# Altium footprint library sun_library.PcbLib: 412 footprints (part 15 of 26)
Each footprint in its own frame and in the unit in brackets; x right, y up, seen from the top. Pads: shape width x height; smd on the part's side, far side on the other; paste and mask are expansions set on the pad; w line width, h text height; cw(c..) or ccw(c..) is an arc to the next point about the centre after c.
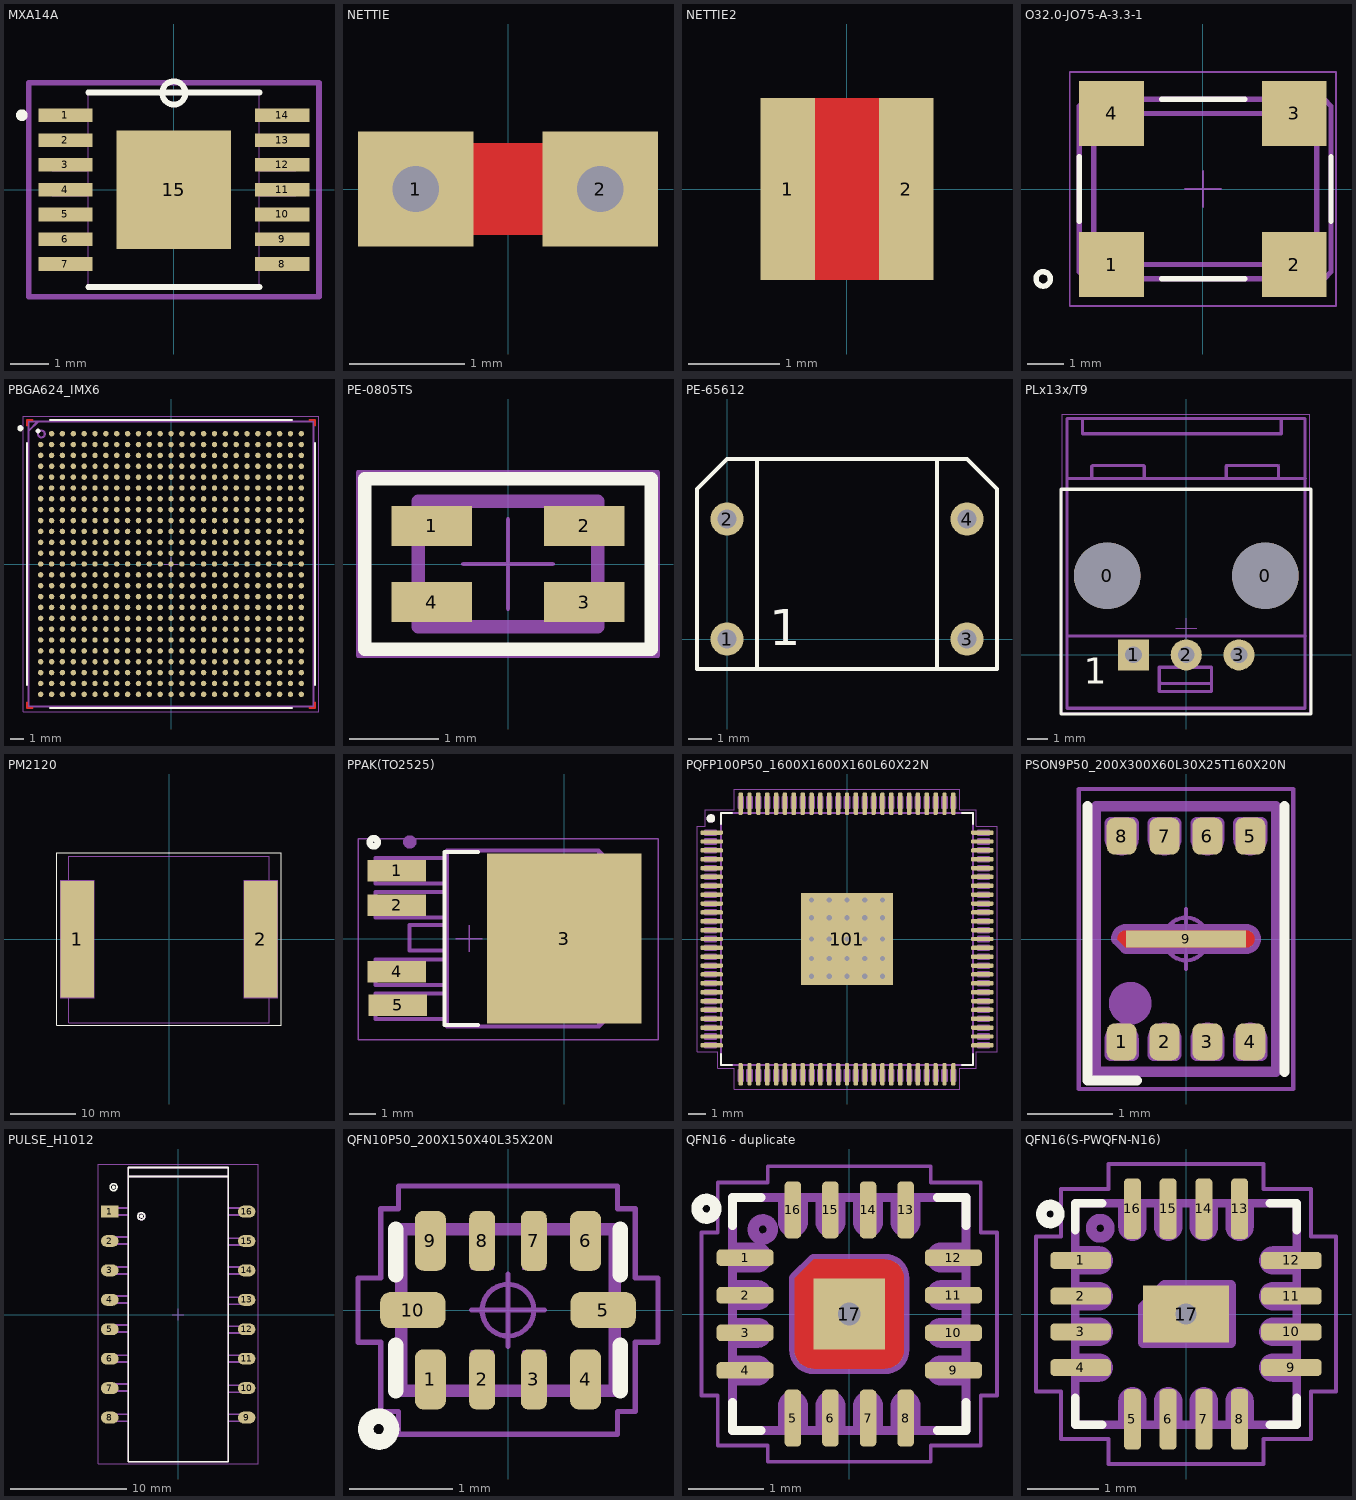
[diagram p14: the footprints below, top view; thin cyan lines are the x and y axes]

## MXA14A [mil]
pads (15):
  rect 56x14 smd paste+0 mask+0: 1(-112,76.77) 2(-112,51.18) 3(-112,25.59) 4(-112,0) 5(-112,-25.59) 6(-112,-51.18) 7(-112,-76.77) 8(112,-76.77) 9(112,-51.18) 10(112,-25.59) 11(112,0) 12(112,25.59) 13(112,51.18) 14(112,76.77)
  rect 118x122 smd paste+0 mask+0: 15(0,0)
Top Overlay:
  lines w6: -88.5,-100.5 88.5,-100.5 ; -88.5,100.5 88.5,100.5 ; -160,77 cw(c-157,77) -157,80 cw(c-157,77) -154,77 cw(c-157,77) -157,74 cw(c-157,77) -160,77 ; -12,100 cw(c0,100) 0,112 cw(c0,100) 12,100 cw(c0,100) 0,88 cw(c0,100) -12,100
3DTop 1:
  lines w1: -160,77 cw(c-157,77) -157,80 cw(c-157,77) -154,77 cw(c-157,77) -157,74 cw(c-157,77) -160,77 ; -126,-82.77 -126,-70.77 -88.5,-70.77 -88.5,-82.77 -126,-82.77 ; -126,-57.18 -126,-45.18 -88.5,-45.18 -88.5,-57.18 -126,-57.18 ; -126,-31.59 -126,-19.59 -88.5,-19.59 -88.5,-31.59 -126,-31.59 ; -126,-6 -126,6 -88.5,6 -88.5,-6 -126,-6 ; -126,19.59 -126,31.59 -88.5,31.59 -88.5,19.59 -126,19.59 ; -126,45.18 -126,57.18 -88.5,57.18 -88.5,45.18 -126,45.18 ; -126,70.77 -126,82.77 -88.5,82.77 -88.5,70.77 -126,70.77 ; -88.5,-100.5 88.5,-100.5 88.5,100.5 -88.5,100.5 -88.5,-100.5 ; -12,100 cw(c0,100) 0,112 cw(c0,100) 12,100 cw(c0,100) 0,88 cw(c0,100) -12,100 ; 88.5,-82.77 88.5,-70.77 126,-70.77 126,-82.77 88.5,-82.77 ; 88.5,-57.18 88.5,-45.18 126,-45.18 126,-57.18 88.5,-57.18 ; 88.5,-31.59 88.5,-19.59 126,-19.59 126,-31.59 88.5,-31.59 ; 88.5,-6 88.5,6 126,6 126,-6 88.5,-6 ; 88.5,19.59 88.5,31.59 126,31.59 126,19.59 88.5,19.59 ; 88.5,45.18 88.5,57.18 126,57.18 126,45.18 88.5,45.18 ; 88.5,70.77 88.5,82.77 126,82.77 126,70.77 88.5,70.77
CourtBot 16:
  lines w6: -150,-110.5 -150,110.5 150,110.5 150,-110.5 -150,-110.5
3D body "User Library-tssop14-2.step": height 47.24, standoff 0, extent -125.98,-100.39 125.99,100.4

## NETTIE [mm]
pads (2):
  rect 1x1 hole 0.4 paste+0: 1(-0.8,0) 2(0.8,0)
Top:
  rectangle: -0.4,-0.4 0.4,0.4
Bottom:
  rectangle: -0.4,-0.4 0.4,0.4

## NETTIE2 [mm]
pads (2):
  rect 0.6x2 smd paste+0: 1(-0.65,0) 2(0.65,0)
Top:
  rectangle: -0.4,-1 0.4,1

## O32.0-JO75-A-3.3-1 [mm]
height 1.2
pads (4):
  rect 1.8x1.8 smd: 1(-2.54,-2.1) 2(2.54,-2.1) 3(2.54,2.1) 4(-2.54,2.1)
Top Overlay:
  lines w0.15: -4.24,-2.5 cw(c-4.44,-2.5) -4.24,-2.49 ; -3.44,-0.9 -3.44,0.9 ; -1.14,-2.5 1.16,-2.5 ; -1.14,2.5 1.16,2.5 ; 3.56,-0.9 3.56,0.9
TopAssy 13:
  lines w0.15: -3.075,-2.5 -3.075,-2.675 -1.95,-2.675 -1.95,-2.5 ; -3.075,2.5 -3.075,2.675 -1.95,2.675 -1.95,2.5 ; 2.075,2.5 2.075,2.675 3.2,2.675 3.2,2.5 ; 2.1,-2.5 2.1,-2.675 3.225,-2.675 3.225,-2.5 ; -3.44,-2.3 -3.44,2.3 -3.24,2.5 3.36,2.5 3.56,2.3 3.56,-2.3 3.36,-2.5 -3.24,-2.5 -3.44,-2.3 ; -3.04,-2.1 -3.04,2.1 3.16,2.1 3.16,-2.1 -3.04,-2.1
CourtTop 15:
  lines w0.05: -0.5,0 0.5,0 ; 0,-0.5 0,0.5 ; -3.7,-3.25 -3.7,3.25 3.7,3.25 3.7,-3.25 -3.7,-3.25
3D body "User Library-GeyerElectronics_KX13.step": height 1.31, standoff 0, extent -3.44,-2.5 3.56,2.5

## PBGA624_IMX6 [mm] "Creator MM"
pads (624):
  round 0.4 smd mask+0.05: A2(-8.8,9.6) A3(-8,9.6) A4(-7.2,9.6) A5(-6.4,9.6) A6(-5.6,9.6) A7(-4.8,9.6) A8(-4,9.6) A9(-3.2,9.6) A10(-2.4,9.6) A11(-1.6,9.6) A12(-0.8,9.6) A13(0,9.6) A14(0.8,9.6) A15(1.6,9.6) A16(2.4,9.6) A17(3.2,9.6) A18(4,9.6) A19(4.8,9.6) A20(5.6,9.6) A21(6.4,9.6) A22(7.2,9.6) A23(8,9.6) A24(8.8,9.6) A25(9.6,9.6) AA1(-9.6,-6.4) AA2(-8.8,-6.4) AA3(-8,-6.4) AA4(-7.2,-6.4) AA5(-6.4,-6.4) AA6(-5.6,-6.4) AA7(-4.8,-6.4) AA8(-4,-6.4) AA9(-3.2,-6.4) AA10(-2.4,-6.4) AA11(-1.6,-6.4) AA12(-0.8,-6.4) AA13(0,-6.4) AA14(0.8,-6.4) AA15(1.6,-6.4) AA16(2.4,-6.4) AA17(3.2,-6.4) AA18(4,-6.4) AA19(4.8,-6.4) AA20(5.6,-6.4) AA21(6.4,-6.4) AA22(7.2,-6.4) AA23(8,-6.4) AA24(8.8,-6.4) AA25(9.6,-6.4) AB1(-9.6,-7.2) AB2(-8.8,-7.2) AB3(-8,-7.2) AB4(-7.2,-7.2) AB5(-6.4,-7.2) AB6(-5.6,-7.2) AB7(-4.8,-7.2) AB8(-4,-7.2) AB9(-3.2,-7.2) AB10(-2.4,-7.2) AB11(-1.6,-7.2) AB12(-0.8,-7.2) AB13(0,-7.2) AB14(0.8,-7.2) AB15(1.6,-7.2) AB16(2.4,-7.2) AB17(3.2,-7.2) AB18(4,-7.2) AB19(4.8,-7.2) AB20(5.6,-7.2) AB21(6.4,-7.2) AB22(7.2,-7.2) AB23(8,-7.2) AB24(8.8,-7.2) AB25(9.6,-7.2) AC1(-9.6,-8) AC2(-8.8,-8) AC3(-8,-8) AC4(-7.2,-8) AC5(-6.4,-8) AC6(-5.6,-8) AC7(-4.8,-8) AC8(-4,-8) AC9(-3.2,-8) AC10(-2.4,-8) AC11(-1.6,-8) AC12(-0.8,-8) AC13(0,-8) AC14(0.8,-8) AC15(1.6,-8) AC16(2.4,-8) AC17(3.2,-8) AC18(4,-8) AC19(4.8,-8) AC20(5.6,-8) AC21(6.4,-8) AC22(7.2,-8) AC23(8,-8) AC24(8.8,-8) AC25(9.6,-8) AD1(-9.6,-8.8) AD2(-8.8,-8.8) AD3(-8,-8.8) AD4(-7.2,-8.8) AD5(-6.4,-8.8) AD6(-5.6,-8.8) AD7(-4.8,-8.8) AD8(-4,-8.8) AD9(-3.2,-8.8) AD10(-2.4,-8.8) AD11(-1.6,-8.8) AD12(-0.8,-8.8) AD13(0,-8.8) AD14(0.8,-8.8) AD15(1.6,-8.8) AD16(2.4,-8.8) AD17(3.2,-8.8) AD18(4,-8.8) AD19(4.8,-8.8) AD20(5.6,-8.8) AD21(6.4,-8.8) AD22(7.2,-8.8) AD23(8,-8.8) AD24(8.8,-8.8) AD25(9.6,-8.8) AE1(-9.6,-9.6) AE2(-8.8,-9.6) AE3(-8,-9.6) AE4(-7.2,-9.6) AE5(-6.4,-9.6) AE6(-5.6,-9.6) AE7(-4.8,-9.6) AE8(-4,-9.6) AE9(-3.2,-9.6) AE10(-2.4,-9.6) AE11(-1.6,-9.6) AE12(-0.8,-9.6) AE13(0,-9.6) AE14(0.8,-9.6) AE15(1.6,-9.6) AE16(2.4,-9.6) AE17(3.2,-9.6) AE18(4,-9.6) AE19(4.8,-9.6) AE20(5.6,-9.6) AE21(6.4,-9.6) AE22(7.2,-9.6) AE23(8,-9.6) AE24(8.8,-9.6) AE25(9.6,-9.6) B1(-9.6,8.8) B2(-8.8,8.8) B3(-8,8.8) B4(-7.2,8.8) B5(-6.4,8.8) B6(-5.6,8.8) B7(-4.8,8.8) B8(-4,8.8) B9(-3.2,8.8) B10(-2.4,8.8) B11(-1.6,8.8) B12(-0.8,8.8) B13(0,8.8) B14(0.8,8.8) B15(1.6,8.8) B16(2.4,8.8) B17(3.2,8.8) B18(4,8.8) B19(4.8,8.8) B20(5.6,8.8) B21(6.4,8.8) B22(7.2,8.8) B23(8,8.8) B24(8.8,8.8) B25(9.6,8.8) C1(-9.6,8) C2(-8.8,8) C3(-8,8) C4(-7.2,8) C5(-6.4,8) C6(-5.6,8) C7(-4.8,8) C8(-4,8) C9(-3.2,8) C10(-2.4,8) C11(-1.6,8) C12(-0.8,8) C13(0,8) C14(0.8,8) C15(1.6,8) C16(2.4,8) C17(3.2,8) C18(4,8) C19(4.8,8) C20(5.6,8) C21(6.4,8) C22(7.2,8) C23(8,8) C24(8.8,8) C25(9.6,8) D1(-9.6,7.2) D2(-8.8,7.2) D3(-8,7.2) D4(-7.2,7.2) D5(-6.4,7.2) D6(-5.6,7.2) D7(-4.8,7.2) D8(-4,7.2) D9(-3.2,7.2) D10(-2.4,7.2) D11(-1.6,7.2) D12(-0.8,7.2) D13(0,7.2) D14(0.8,7.2) D15(1.6,7.2) D16(2.4,7.2) D17(3.2,7.2) D18(4,7.2) D19(4.8,7.2) D20(5.6,7.2) D21(6.4,7.2) D22(7.2,7.2) D23(8,7.2) D24(8.8,7.2) D25(9.6,7.2) E1(-9.6,6.4) E2(-8.8,6.4) E3(-8,6.4) E4(-7.2,6.4) E5(-6.4,6.4) E6(-5.6,6.4) E7(-4.8,6.4) E8(-4,6.4) E9(-3.2,6.4) E10(-2.4,6.4) E11(-1.6,6.4) E12(-0.8,6.4) E13(0,6.4) E14(0.8,6.4) E15(1.6,6.4) E16(2.4,6.4) E17(3.2,6.4) E18(4,6.4) E19(4.8,6.4) E20(5.6,6.4) E21(6.4,6.4) E22(7.2,6.4) E23(8,6.4) E24(8.8,6.4) E25(9.6,6.4) F1(-9.6,5.6) F2(-8.8,5.6) F3(-8,5.6) F4(-7.2,5.6) F5(-6.4,5.6) F6(-5.6,5.6) F7(-4.8,5.6) F8(-4,5.6) F9(-3.2,5.6) F10(-2.4,5.6) F11(-1.6,5.6) F12(-0.8,5.6) F13(0,5.6) F14(0.8,5.6) F15(1.6,5.6) F16(2.4,5.6) F17(3.2,5.6) F18(4,5.6) F19(4.8,5.6) F20(5.6,5.6) F21(6.4,5.6) F22(7.2,5.6) F23(8,5.6) F24(8.8,5.6) F25(9.6,5.6) G1(-9.6,4.8) G2(-8.8,4.8) G3(-8,4.8) G4(-7.2,4.8) G5(-6.4,4.8) G6(-5.6,4.8) G7(-4.8,4.8) G8(-4,4.8) G9(-3.2,4.8) G10(-2.4,4.8) G11(-1.6,4.8) G12(-0.8,4.8) G13(0,4.8) G14(0.8,4.8) G15(1.6,4.8) G16(2.4,4.8) G17(3.2,4.8) G18(4,4.8) G19(4.8,4.8) G20(5.6,4.8) G21(6.4,4.8) G22(7.2,4.8) G23(8,4.8) G24(8.8,4.8) G25(9.6,4.8) H1(-9.6,4) H2(-8.8,4) H3(-8,4) H4(-7.2,4) H5(-6.4,4) H6(-5.6,4) H7(-4.8,4) H8(-4,4) H9(-3.2,4) H10(-2.4,4) H11(-1.6,4) H12(-0.8,4) H13(0,4) H14(0.8,4) H15(1.6,4) H16(2.4,4) H17(3.2,4) H18(4,4) H19(4.8,4) H20(5.6,4) H21(6.4,4) H22(7.2,4) H23(8,4) H24(8.8,4) H25(9.6,4) J1(-9.6,3.2) J2(-8.8,3.2) J3(-8,3.2) J4(-7.2,3.2) J5(-6.4,3.2) J6(-5.6,3.2) J7(-4.8,3.2) J8(-4,3.2) J9(-3.2,3.2) J10(-2.4,3.2) J11(-1.6,3.2) J12(-0.8,3.2) J13(0,3.2) J14(0.8,3.2) J15(1.6,3.2) J16(2.4,3.2) J17(3.2,3.2) J18(4,3.2) J19(4.8,3.2) J20(5.6,3.2) J21(6.4,3.2) J22(7.2,3.2) J23(8,3.2) J24(8.8,3.2) J25(9.6,3.2) K1(-9.6,2.4) K2(-8.8,2.4) K3(-8,2.4) K4(-7.2,2.4) K5(-6.4,2.4) K6(-5.6,2.4) K7(-4.8,2.4) K8(-4,2.4) K9(-3.2,2.4) K10(-2.4,2.4) K11(-1.6,2.4) K12(-0.8,2.4) K13(0,2.4) K14(0.8,2.4) K15(1.6,2.4) K16(2.4,2.4) K17(3.2,2.4) K18(4,2.4) K19(4.8,2.4) K20(5.6,2.4) K21(6.4,2.4) K22(7.2,2.4) K23(8,2.4) K24(8.8,2.4) K25(9.6,2.4) L1(-9.6,1.6) L2(-8.8,1.6) L3(-8,1.6) L4(-7.2,1.6) L5(-6.4,1.6) L6(-5.6,1.6) L7(-4.8,1.6) L8(-4,1.6) L9(-3.2,1.6) L10(-2.4,1.6) L11(-1.6,1.6) L12(-0.8,1.6) L13(0,1.6) L14(0.8,1.6) L15(1.6,1.6) L16(2.4,1.6) L17(3.2,1.6) L18(4,1.6) L19(4.8,1.6) L20(5.6,1.6) L21(6.4,1.6) L22(7.2,1.6) L23(8,1.6) L24(8.8,1.6) L25(9.6,1.6) M1(-9.6,0.8) M2(-8.8,0.8) M3(-8,0.8) M4(-7.2,0.8) M5(-6.4,0.8) M6(-5.6,0.8) M7(-4.8,0.8) M8(-4,0.8) M9(-3.2,0.8) M10(-2.4,0.8) M11(-1.6,0.8) M12(-0.8,0.8) M13(0,0.8) M14(0.8,0.8) M15(1.6,0.8) M16(2.4,0.8) M17(3.2,0.8) M18(4,0.8) M19(4.8,0.8) M20(5.6,0.8) M21(6.4,0.8) M22(7.2,0.8) M23(8,0.8) M24(8.8,0.8) M25(9.6,0.8) N1(-9.6,0) N2(-8.8,0) N3(-8,0) N4(-7.2,0) N5(-6.4,0) N6(-5.6,0) N7(-4.8,0) N8(-4,0) N9(-3.2,0) N10(-2.4,0) N11(-1.6,0) N12(-0.8,0) N13(0,0) N14(0.8,0) N15(1.6,0) N16(2.4,0) N17(3.2,0) N18(4,0) N19(4.8,0) N20(5.6,0) N21(6.4,0) N22(7.2,0) N23(8,0) N24(8.8,0) N25(9.6,0) P1(-9.6,-0.8) P2(-8.8,-0.8) P3(-8,-0.8) P4(-7.2,-0.8) P5(-6.4,-0.8) P6(-5.6,-0.8) P7(-4.8,-0.8) P8(-4,-0.8) P9(-3.2,-0.8) P10(-2.4,-0.8) P11(-1.6,-0.8) P12(-0.8,-0.8) P13(0,-0.8) P14(0.8,-0.8) P15(1.6,-0.8) P16(2.4,-0.8) P17(3.2,-0.8) P18(4,-0.8) P19(4.8,-0.8) P20(5.6,-0.8) P21(6.4,-0.8) P22(7.2,-0.8) P23(8,-0.8) P24(8.8,-0.8) P25(9.6,-0.8) R1(-9.6,-1.6) R2(-8.8,-1.6) R3(-8,-1.6) R4(-7.2,-1.6) R5(-6.4,-1.6) R6(-5.6,-1.6) R7(-4.8,-1.6) R8(-4,-1.6) R9(-3.2,-1.6) R10(-2.4,-1.6) R11(-1.6,-1.6) R12(-0.8,-1.6) R13(0,-1.6) R14(0.8,-1.6) R15(1.6,-1.6) R16(2.4,-1.6) R17(3.2,-1.6) R18(4,-1.6) R19(4.8,-1.6) R20(5.6,-1.6) R21(6.4,-1.6) R22(7.2,-1.6) R23(8,-1.6) R24(8.8,-1.6) R25(9.6,-1.6) T1(-9.6,-2.4) T2(-8.8,-2.4) T3(-8,-2.4) T4(-7.2,-2.4) T5(-6.4,-2.4) T6(-5.6,-2.4) T7(-4.8,-2.4) T8(-4,-2.4) T9(-3.2,-2.4) T10(-2.4,-2.4) T11(-1.6,-2.4) T12(-0.8,-2.4) T13(0,-2.4) T14(0.8,-2.4) T15(1.6,-2.4) T16(2.4,-2.4) T17(3.2,-2.4) T18(4,-2.4) T19(4.8,-2.4) T20(5.6,-2.4) T21(6.4,-2.4) T22(7.2,-2.4) T23(8,-2.4) T24(8.8,-2.4) T25(9.6,-2.4) U1(-9.6,-3.2) U2(-8.8,-3.2) U3(-8,-3.2) U4(-7.2,-3.2) U5(-6.4,-3.2) U6(-5.6,-3.2) U7(-4.8,-3.2) U8(-4,-3.2) U9(-3.2,-3.2) U10(-2.4,-3.2) U11(-1.6,-3.2) U12(-0.8,-3.2) U13(0,-3.2) U14(0.8,-3.2) U15(1.6,-3.2) U16(2.4,-3.2) U17(3.2,-3.2) U18(4,-3.2) U19(4.8,-3.2) U20(5.6,-3.2) U21(6.4,-3.2) U22(7.2,-3.2) U23(8,-3.2) U24(8.8,-3.2) U25(9.6,-3.2) V1(-9.6,-4) V2(-8.8,-4) V3(-8,-4) V4(-7.2,-4) V5(-6.4,-4) V6(-5.6,-4) V7(-4.8,-4) V8(-4,-4) V9(-3.2,-4) V10(-2.4,-4) V11(-1.6,-4) V12(-0.8,-4) V13(0,-4) V14(0.8,-4) V15(1.6,-4) V16(2.4,-4) V17(3.2,-4) V18(4,-4) V19(4.8,-4) V20(5.6,-4) V21(6.4,-4) V22(7.2,-4) V23(8,-4) V24(8.8,-4) V25(9.6,-4) W1(-9.6,-4.8) W2(-8.8,-4.8) W3(-8,-4.8) W4(-7.2,-4.8) W5(-6.4,-4.8) W6(-5.6,-4.8) W7(-4.8,-4.8) W8(-4,-4.8) W9(-3.2,-4.8) W10(-2.4,-4.8) W11(-1.6,-4.8) W12(-0.8,-4.8) W13(0,-4.8) W14(0.8,-4.8) W15(1.6,-4.8) W16(2.4,-4.8) W17(3.2,-4.8) W18(4,-4.8) W19(4.8,-4.8) W20(5.6,-4.8) W21(6.4,-4.8) W22(7.2,-4.8) W23(8,-4.8) W24(8.8,-4.8) W25(9.6,-4.8) Y1(-9.6,-5.6) Y2(-8.8,-5.6) Y3(-8,-5.6) Y4(-7.2,-5.6) Y5(-6.4,-5.6) Y6(-5.6,-5.6) Y7(-4.8,-5.6) Y8(-4,-5.6) Y9(-3.2,-5.6) Y10(-2.4,-5.6) Y11(-1.6,-5.6) Y12(-0.8,-5.6) Y13(0,-5.6) Y14(0.8,-5.6) Y15(1.6,-5.6) Y16(2.4,-5.6) Y17(3.2,-5.6) Y18(4,-5.6) Y19(4.8,-5.6) Y20(5.6,-5.6) Y21(6.4,-5.6) Y22(7.2,-5.6) Y23(8,-5.6) Y24(8.8,-5.6) Y25(9.6,-5.6)
Top:
  lines w0.15: -10.6,-10.2 -10.6,-10.6 -10.2,-10.6 ; -10.6,10.2 -10.6,10.6 -10.2,10.6 ; 10.2,-10.6 10.6,-10.6 10.6,-10.2 ; 10.2,10.6 10.6,10.6 10.6,10.2
Top Overlay:
  circle w0.15: c-9.8,9.8 r0.1
  circle w0.25: c-11.1,10 r0.1
  lines w0.15: -10.6,-8.9 -10.6,8.9 ; -8.9,-10.6 8.9,-10.6 ; -8.9,10.6 8.9,10.6 ; 10.6,-8.9 10.6,8.9
TopAssy 13:
  circle w0.15: c-9.55,9.575 r0.251
  lines w0.15: -10.487,9.813 -9.8,10.5 ; -10.5,-10.5 -10.5,10.499 10.5,10.499 10.5,-10.5 -10.5,-10.5
  text ".Designator" at -1.8,-0.3 h2.69
CourtTop 15:
  lines w0.05: -0.5,0 0.5,0 ; 0,-0.5 0,0.5 ; -10.9,-10.9 10.9,-10.9 10.9,10.9 -10.9,10.9 -10.9,-10.9
Mechanical 29:
  text ".Designator" at -0.5,1 h1.52
3D body "User Library-imx6.STEP": height 1.31, standoff -0.05, extent -10.5,-10.501 10.5,10.499

## PE-0805TS [mm] "PE-0805CCMC 2-Line Chip Style  Common Mode Chokes"
height 1.2
pads (4):
  rect 0.9x0.45 smd: 1(-0.85,0.425) 2(0.85,0.425) 3(0.85,-0.425) 4(-0.85,-0.425)
Top Overlay:
  lines w0.15: -1.6,-0.95 -1.6,0.95 1.6,0.95 1.6,-0.95 -1.6,-0.95
TopAssy 13:
  lines w0.15: -1,-0.7 1,-0.7 1,0.7 -1,0.7 -1,-0.7
CourtTop 15:
  lines w0.05: -0.5,0 0.5,0 ; 0,-0.5 0,0.5 ; -1.675,-1.025 1.675,-1.025 1.675,1.025 -1.675,1.025 -1.675,-1.025
3D body "Coilcraft-0805USB.step": height 1.64, standoff -0.01, extent -1.01,-0.645 1.01,0.645

## PE-65612 [mm] "TRANSFORMERS FOR DIGITAL  AUDIO DATA TRANSMISSION"
pads (4):
  round 1.4 hole 0.8: 1(0,0) 2(0,5.08) 3(10.16,0) 4(10.16,5.08)
Top Overlay:
  lines w0.15: 1.27,-1.27 1.27,7.62 ; 8.89,-1.27 8.89,7.62 ; -1.27,-1.27 11.43,-1.27 11.43,6.35 10.16,7.62 0,7.62 -1.27,6.35 -1.27,-1.27
  text "1" at 1.778,-0.254 h1.52

## PLx13x/T9 [mm] "Photolink- Fiber Optic Receiver & Transmitter Unit"
height 20
pads (5):
  round 3.2 hole 3.2 unplated: 0(-3.81,3.81) 0(3.81,3.81)
  rect 1.5x1.5 hole 0.8: 1(-2.54,0)
  round 1.5 hole 0.8: 2(0,0) 3(2.54,0)
Top Overlay:
  lines w0.15: -6.025,-2.85 6,-2.85 6,7.975 -6.025,7.975 -6.025,-2.85
  text "1" at -4.94,-1.4 h1.27
TopAssy 13:
  lines w0.15: -5.725,0.9 5.75,0.9 ; -5.725,8.5 5.75,8.5 ; -5,11.375 -5,10.65 4.575,10.65 4.575,11.375 ; -4.55,8.525 -4.55,9.1 ; -4.525,9.125 -2.05,9.125 ; -2.025,8.5 -2.025,9.1 ; -1.3,-1.3 -1.225,-1.375 1.225,-1.375 ; 1.925,8.525 1.925,9.1 1.95,9.125 4.425,9.125 4.45,9.1 4.45,8.5 ; -5.75,-2.575 5.725,-2.575 5.725,11.375 -5.75,11.375 -5.75,-2.575 ; -3,-0.349 -2.2,-0.349 -2.2,0.426 -3,0.426 -3,-0.349 ; -1.3,-1.775 -1.3,-0.6 1.225,-0.6 1.225,-1.775 -1.3,-1.775
CourtTop 15:
  lines w0.05: -0.5,1.27 0.5,1.27 ; 0,0.77 0,1.77 ; -5.975,-2.8 -5.975,11.6 5.95,11.6 5.95,-2.8 -5.975,-2.8
3D body "User Library-PLT133_T9.step": height 19.34, standoff -3.95, extent -5.75,-2.575 5.75,11.225

## PM2120 [mm] "High Current SMD Toroid Power Inductors BOURNS"
height 23
pads (2):
  rect 5.1x17.8 smd: 1(-14,0) 2(14,0)
Top Overlay:
  lines w0.15: -17.1,-13.1 17.1,-13.1 17.1,13.2 -17.1,13.2 -17.1,-13.1
TopAssy 13:
  region: 16.6,-9 11.4,-9 11.4,9 16.6,9
  region: -16.6,9 -11.4,9 -11.4,-9 -16.6,-9
  lines w0.15: -15.3,-12.7 -15.3,12.7 15.3,12.7 15.3,-12.7 -15.3,-12.7
3D body "pm2120-121k-rc.stp": height 22.08, standoff -0.02, extent -15.25,-12.7 15.25,12.7

## PPAK(TO2525) [mm]
height 2.39
pads (5):
  rect 2.2x0.8 smd: 1(-6.3,2.54) 2(-6.3,1.25) 4(-6.3,-1.25) 5(-6.25,-2.5)
  rect 5.8x6.4 smd paste-5: 3(0,0)
Top Overlay:
  circle w0.25: c-7.16,3.615 r0.149
  lines w0.15: -3.25,-3.25 -4.5,-3.25 -4.5,3.25 -3.25,3.25
Top Paste:
  rectangle: -2.66,0.375 -0.585,2.9
  rectangle: 0.515,0.4 2.59,2.925
  region: -0.585,-0.4 -2.66,-0.4 -2.66,-2.925 -0.585,-2.925
  region: 2.59,-0.4 0.515,-0.4 0.515,-2.925 2.59,-2.925
TopAssy 13:
  circle w0.25: c-5.805,3.625 r0.125
  lines w0.15: -4.4,-3.015 -7.1,-3.015 -7.1,-2.065 -4.4,-2.065 ; -4.4,-1.745 -7.1,-1.745 -7.1,-0.795 -4.4,-0.795 ; -4.4,-0.45 -5.81,-0.45 -5.81,0.5 -4.4,0.5 ; -4.4,0.795 -7.1,0.795 -7.1,1.745 -4.4,1.745 ; -4.4,2.065 -7.1,2.065 -7.1,3.015 -4.4,3.015 ; 1.29,-3.3 -4.4,-3.3 -4.4,3.3 1.29,3.3 ; 1.295,-3.295 2.59,-2 2.59,2 1.295,3.295 1.295,-3.295
CourtTop 15:
  lines w0.05: -4.08,0 -3.08,0 ; -3.58,-0.5 -3.58,0.5 ; -7.75,-3.8 -7.75,3.75 3.515,3.75 3.515,-3.8 -7.75,-3.8
3D body "User Library-PPAK.step": height 2.3, standoff 0, extent -7.175,-3.2 2.525,3.2

## PQFP100P50_1600X1600X160L60X22N [mm] "Quad Flat Pack (QFP), 0.50 mm pitch; square, 25 pin X 25 pin, 14.00 mm L X 14.00 mm W X 1.60 mm H body"
height 1.6
pads (101):
  rrect53% 1.26x0.25 smd mask+0.075: 1(-7.63,6) 2(-7.63,5.5) 3(-7.63,5) 4(-7.63,4.5) 5(-7.63,4) 6(-7.63,3.5) 7(-7.63,3) 8(-7.63,2.5) 9(-7.63,2) 10(-7.63,1.5) 11(-7.63,1) 12(-7.63,0.5) 13(-7.63,0) 14(-7.63,-0.5) 15(-7.63,-1) 16(-7.63,-1.5) 17(-7.63,-2) 18(-7.63,-2.5) 19(-7.63,-3) 20(-7.63,-3.5) 21(-7.63,-4) 22(-7.63,-4.5) 23(-7.63,-5) 24(-7.63,-5.5) 25(-7.63,-6) 51(7.63,-6) 52(7.63,-5.5) 53(7.63,-5) 54(7.63,-4.5) 55(7.63,-4) 56(7.63,-3.5) 57(7.63,-3) 58(7.63,-2.5) 59(7.63,-2) 60(7.63,-1.5) 61(7.63,-1) 62(7.63,-0.5) 63(7.63,0) 64(7.63,0.5) 65(7.63,1) 66(7.63,1.5) 67(7.63,2) 68(7.63,2.5) 69(7.63,3) 70(7.63,3.5) 71(7.63,4) 72(7.63,4.5) 73(7.63,5) 74(7.63,5.5) 75(7.63,6)
  rrect53% 0.25x1.26 smd mask+0.075: 26(-6,-7.63) 27(-5.5,-7.63) 28(-5,-7.63) 29(-4.5,-7.63) 30(-4,-7.63) 31(-3.5,-7.63) 32(-3,-7.63) 33(-2.5,-7.63) 34(-2,-7.63) 35(-1.5,-7.63) 36(-1,-7.63) 37(-0.5,-7.63) 38(0,-7.63) 39(0.5,-7.63) 40(1,-7.63) 41(1.5,-7.63) 42(2,-7.63) 43(2.5,-7.63) 44(3,-7.63) 45(3.5,-7.63) 46(4,-7.63) 47(4.5,-7.63) 48(5,-7.63) 49(5.5,-7.63) 50(6,-7.63) 76(6,7.63) 77(5.5,7.63) 78(5,7.63) 79(4.5,7.63) 80(4,7.63) 81(3.5,7.63) 82(3,7.63) 83(2.5,7.63) 84(2,7.63) 85(1.5,7.63) 86(1,7.63) 87(0.5,7.63) 88(0,7.63) 89(-0.5,7.63) 90(-1,7.63) 91(-1.5,7.63) 92(-2,7.63) 93(-2.5,7.63) 94(-3,7.63) 95(-3.5,7.63) 96(-4,7.63) 97(-4.5,7.63) 98(-5,7.63) 99(-5.5,7.63) 100(-6,7.63)
  rect 5.2x5.2 smd: 101(0,0)
via -2,-2.1 diameter 0.6 hole 0.3
via -1,-2.1 diameter 0.6 hole 0.3
via 0,-2.1 diameter 0.6 hole 0.3
via 1,-2.1 diameter 0.6 hole 0.3
via 2,-2.1 diameter 0.6 hole 0.3
via -2,-1.1 diameter 0.6 hole 0.3
via -1,-1.1 diameter 0.6 hole 0.3
via 0,-1.1 diameter 0.6 hole 0.3
via 1,-1.1 diameter 0.6 hole 0.3
via 2,-1.1 diameter 0.6 hole 0.3
via -2,0 diameter 0.6 hole 0.3
via -1,0 diameter 0.6 hole 0.3
via 0,0 diameter 0.6 hole 0.3
via 1,0 diameter 0.6 hole 0.3
via 2,0 diameter 0.6 hole 0.3
via -2,1.2 diameter 0.6 hole 0.3
via -1,1.2 diameter 0.6 hole 0.3
via 0,1.2 diameter 0.6 hole 0.3
via 1,1.2 diameter 0.6 hole 0.3
via 2,1.2 diameter 0.6 hole 0.3
via 2,2.2 diameter 0.6 hole 0.3
via 1,2.2 diameter 0.6 hole 0.3
via 0,2.2 diameter 0.6 hole 0.3
via -1,2.2 diameter 0.6 hole 0.3
via -2,2.2 diameter 0.6 hole 0.3
Top Overlay:
  circle w0.15: c-7.675,6.8 r0.168
  circle w0.15: c-7.675,6.8 r0.079
  lines w0.12: -7.1,-6.5 -7.1,-7.1 -6.5,-7.1 ; -7.1,6.5 -7.1,7.1 -6.5,7.1 ; 6.5,-7.1 7.1,-7.1 7.1,-6.5 ; 6.5,7.1 7.1,7.1 7.1,6.5
TopAssy 13:
  drawing of 406 lines, arcs and shapes, not listed
CourtTop 15:
  circle w0.05: c0,0 r0.25
  lines w0.05: -0.35,0 0.35,0 ; 0,-0.35 0,0.35 ; -8.46,-6.35 -7.3,-6.35 -7.3,-7.3 -6.35,-7.3 -6.35,-8.46 6.35,-8.46 6.35,-7.3 7.3,-7.3 7.3,-6.35 8.46,-6.35 8.46,6.35 7.3,6.35 7.3,7.3 6.35,7.3 6.35,8.46 -6.35,8.46 -6.35,7.3 -8,7.3 -8,6.35 -8.46,6.35 -8.46,-6.35
3D body "QFP100P50_1600X1600X160L60X22.STEP": height 1.6, standoff 0, extent -8,-8 8,8

## PSON9P50_200X300X60L30X25T160X20N [mm] "Pullback Small Outline No-Lead (PSON with Tab), 0.50 mm pitch; 8 pin, 2.00 mm L X 3.00 mm W X 0.60 mm H body"
height 0.6
pads (9):
  rrect51% 0.35x0.43 smd: 1(-0.75,-1.2) 2(-0.25,-1.2) 3(0.25,-1.2) 4(0.75,-1.2) 5(0.75,1.2) 6(0.25,1.2) 7(-0.25,1.2) 8(-0.75,1.2)
  rect 1.4x0.2 smd paste-1.4 mask-1.4: 9(0,0)
Top:
  region: 0.8,0 0.799,-0.016 0.795,-0.031 0.789,-0.045 0.781,-0.059 0.771,-0.071 0.759,-0.081 0.745,-0.089 0.731,-0.095 0.716,-0.099 -0.7,-0.1 -0.8,0 -0.799,0.016 -0.795,0.031 -0.789,0.045 -0.781,0.059 -0.771,0.071 -0.759,0.081 -0.745,0.089 -0.731,0.095 -0.716,0.099 0.7,0.1 0.716,0.099 0.731,0.095 0.745,0.089 0.759,0.081 0.771,0.071 0.781,0.059 0.789,0.045 0.795,0.031 0.799,0.016 0.8,0
Top Overlay:
  lines w0.12: -1.15,1.55 -1.15,-1.65 -0.575,-1.65 ; 1.15,-1.55 1.15,1.55
Top Solder:
  region: 0.8,0 0.799,-0.016 0.795,-0.031 0.789,-0.045 0.781,-0.059 0.771,-0.071 0.759,-0.081 0.745,-0.089 0.731,-0.095 0.716,-0.099 -0.7,-0.1 -0.8,0 -0.799,0.016 -0.795,0.031 -0.789,0.045 -0.781,0.059 -0.771,0.071 -0.759,0.081 -0.745,0.089 -0.731,0.095 -0.716,0.099 0.7,0.1 0.716,0.099 0.731,0.095 0.745,0.089 0.759,0.081 0.771,0.071 0.781,0.059 0.789,0.045 0.795,0.031 0.799,0.016 0.8,0
TopAssy 13:
  circle w0.25: c-0.65,-0.75 r0.125
  lines w0.12: -1.05,-1.55 1.05,-1.55 1.05,1.55 -1.05,1.55 -1.05,-1.55
  lines w0.15: -0.875,-1.35 -0.625,-1.35 -0.625,-1.175 ccw(c-0.75,-1.175) -0.875,-1.175 -0.875,-1.35 ; -0.875,1.175 ccw(c-0.75,1.175) -0.625,1.175 -0.625,1.35 -0.875,1.35 -0.875,1.175 ; -0.8,0 cw(c-0.7,0) -0.7,0.1 0.7,0.1 cw(c0.7,0) 0.8,0 cw(c0.7,0) 0.7,-0.1 -0.7,-0.1 -0.8,0 ; -0.375,-1.35 -0.125,-1.35 -0.125,-1.175 ccw(c-0.25,-1.175) -0.375,-1.175 -0.375,-1.35 ; -0.375,1.175 ccw(c-0.25,1.175) -0.125,1.175 -0.125,1.35 -0.375,1.35 -0.375,1.175 ; 0.125,-1.35 0.375,-1.35 0.375,-1.175 ccw(c0.25,-1.175) 0.125,-1.175 0.125,-1.35 ; 0.125,1.175 ccw(c0.25,1.175) 0.375,1.175 0.375,1.35 0.125,1.35 0.125,1.175 ; 0.625,-1.35 0.875,-1.35 0.875,-1.175 ccw(c0.75,-1.175) 0.625,-1.175 0.625,-1.35 ; 0.625,1.175 ccw(c0.75,1.175) 0.875,1.175 0.875,1.35 0.625,1.35 0.625,1.175
CourtTop 15:
  circle w0.05: c0,0 r0.25
  lines w0.05: -0.35,0 0.35,0 ; 0,-0.35 0,0.35 ; -1.25,-1.75 1.25,-1.75 1.25,1.75 -1.25,1.75 -1.25,-1.75
3D body "PSON9P50_200X300X60L30X25T160X20.STEP": height 0.6, standoff 0, extent -1,-1.5 1,1.5

## PULSE_H1012 [mm]
pads (16):
  rect 1.52x1.02 smd: 1(-5.91,8.89)
  oval 1.52x1.02 smd: 2(-5.91,6.35) 3(-5.91,3.81) 4(-5.91,1.27) 5(-5.91,-1.27) 6(-5.91,-3.81) 7(-5.91,-6.35) 8(-5.91,-8.89) 9(5.91,-8.89) 10(5.91,-6.35) 11(5.91,-3.81) 12(5.91,-1.27) 13(5.91,1.27) 14(5.91,3.81) 15(5.91,6.35) 16(5.91,8.89)
Top Overlay:
  circle w0.15: c-5.575,11 r0.075
  circle w0.15: c-5.575,11 r0.3
  circle w0.15: c-3.185,8.49 r0.075
  circle w0.15: c-3.185,8.49 r0.3
  lines w0.15: -4.315,11.915 4.315,11.915 ; -4.315,-12.7 -4.315,12.7 4.315,12.7 4.315,-12.7 -4.315,-12.7
TopAssy 13:
  circle w0.15: c-3.185,8.49 r0.3
  circle w0.15: c-3.185,8.49 r0.075
  lines w0.15: -4.315,-9.2 -6.225,-9.2 -6.225,-8.6 -4.315,-8.6 ; -4.315,-6.6 -6.225,-6.6 -6.225,-6 -4.315,-6 ; -4.315,-4.1 -6.225,-4.1 -6.225,-3.5 -4.315,-3.5 ; -4.315,-1.5 -6.225,-1.5 -6.225,-0.9 -4.315,-0.9 ; -4.315,1 -6.225,1 -6.225,1.6 -4.315,1.6 ; -4.315,3.5 -6.225,3.5 -6.225,4.1 -4.315,4.1 ; -4.315,6.1 -6.225,6.1 -6.225,6.7 -4.315,6.7 ; -4.315,8.6 -6.225,8.6 -6.225,9.2 -4.315,9.2 ; -4.315,11.915 4.315,11.915 ; 4.3,-9.2 6.21,-9.2 6.21,-8.6 4.3,-8.6 ; 4.3,-6.7 6.21,-6.7 6.21,-6.1 4.3,-6.1 ; 4.3,-4.1 6.21,-4.1 6.21,-3.5 4.3,-3.5 ; 4.3,-1.6 6.21,-1.6 6.21,-1 4.3,-1 ; 4.3,0.9 6.21,0.9 6.21,1.5 4.3,1.5 ; 4.3,3.5 6.21,3.5 6.21,4.1 4.3,4.1 ; 4.3,6 6.21,6 6.21,6.6 4.3,6.6 ; 4.3,8.6 6.21,8.6 6.21,9.2 4.3,9.2 ; -4.315,-12.7 4.315,-12.7 4.315,12.7 -4.315,12.7 -4.315,-12.7
CourtTop 15:
  lines w0.05: -0.5,0 0.5,0 ; 0,-0.5 0,0.5 ; -6.9,-12.9 -6.9,13 6.9,13 6.9,-12.9 -6.9,-12.9
3D body "S558-5999-46-F-L.stp": height 5.97, standoff 0, extent -6.25,-12.7 6.45,12.7

## QFN10P50_200X150X40L35X20N [mm] "Quad Flat No-Lead (QFN), 0.50 mm pitch; rect., 4 pin X 1 pin, 2.00 mm L X 1.50 mm W X 0.40 mm H body"
height 0.4
pads (10):
  rrect55% 0.3x0.58 smd mask+0.05: 1(-0.75,-0.67) 4(0.75,-0.67) 6(0.75,0.67) 9(-0.75,0.67)
  rrect55% 0.25x0.58 smd mask+0.05: 2(-0.25,-0.67) 3(0.25,-0.67) 7(0.25,0.67) 8(-0.25,0.67)
  rrect55% 0.63x0.35 smd mask+0.05: 5(0.92,0) 10(-0.92,0)
Top Overlay:
  circle w0.15: c-1.25,-1.15 r0.125
  lines w0.15: -1.085,-0.78 -1.085,-0.34 ; -1.085,0.34 -1.085,0.78 ; 1.085,-0.78 1.085,-0.34 ; 1.085,0.34 1.085,0.78
Mechanical 12:
  lines w0.025: -1,-0.75 -1,0.75 1,0.75 1,-0.75 -1,-0.75 ; -1,-0.1 -0.65,-0.1 -0.65,0.1 -1,0.1 -1,-0.1 ; -0.85,-0.75 -0.65,-0.75 -0.65,-0.4 -0.85,-0.4 -0.85,-0.75 ; -0.85,0.4 -0.65,0.4 -0.65,0.75 -0.85,0.75 -0.85,0.4 ; -0.35,-0.75 -0.15,-0.75 -0.15,-0.4 -0.35,-0.4 -0.35,-0.75 ; -0.35,0.4 -0.15,0.4 -0.15,0.75 -0.35,0.75 -0.35,0.4 ; 0.15,-0.75 0.35,-0.75 0.35,-0.4 0.15,-0.4 0.15,-0.75 ; 0.15,0.4 0.35,0.4 0.35,0.75 0.15,0.75 0.15,0.4 ; 0.65,-0.75 0.85,-0.75 0.85,-0.4 0.65,-0.4 0.65,-0.75 ; 0.65,-0.1 0.65,0.1 1,0.1 1,-0.1 0.65,-0.1 ; 0.65,0.4 0.85,0.4 0.85,0.75 0.65,0.75 0.65,0.4
TopAssy 13:
  lines w0.12: -1.03,-0.78 -1.03,0.78 1.03,0.78 1.03,-0.78 -1.03,-0.78
CourtTop 15:
  circle w0.05: c0,0 r0.25
  lines w0.05: -0.35,0 0.35,0 ; 0,-0.35 0,0.35 ; -1.45,-0.31 -1.45,0.31 -1.23,0.31 -1.23,0.98 -1.06,0.98 -1.06,1.2 1.06,1.2 1.06,0.98 1.23,0.98 1.23,0.31 1.45,0.31 1.45,-0.31 1.23,-0.31 1.23,-0.98 1.06,-0.98 1.06,-1.2 -1.06,-1.2 -1.06,-0.98 -1.23,-0.98 -1.23,-0.31 -1.45,-0.31
3D body "QFN10P50_200X150X40L35X20.STEP": height 0.4, standoff 0, extent -1.05,-0.8 1.05,0.8

## QFN16 - duplicate [mm] "Quad Flat No-Lead (QFN with Tab), 0.50 mm pitch; square, 4 pin X 4 pin, 3.00 mm L X 3.00 mm W X 0.80 mm H body"
height 0.8
pads (17):
  rrect52% 0.76x0.22 smd mask+0.075: 1(-1.385,0.75) 2(-1.385,0.25) 3(-1.385,-0.25) 4(-1.385,-0.75) 9(1.385,-0.75) 10(1.385,-0.25) 11(1.385,0.25) 12(1.385,0.75)
  rrect52% 0.22x0.76 smd mask+0.075: 5(-0.75,-1.385) 6(-0.25,-1.385) 7(0.25,-1.385) 8(0.75,-1.385) 13(0.75,1.385) 14(0.25,1.385) 15(-0.25,1.385) 16(-0.75,1.385)
  rect 0.95x0.95 smd paste-0.95 mask+0: 17(0,0)
via 0,0 diameter 0.6 hole 0.3
Top:
  region: 0,-0.725 -0.475,-0.725 -0.514,-0.722 -0.552,-0.713 -0.589,-0.698 -0.622,-0.677 -0.652,-0.652 -0.677,-0.622 -0.698,-0.589 -0.713,-0.552 -0.722,-0.514 -0.725,0.475 -0.475,0.725 0.475,0.725 0.514,0.722 0.552,0.713 0.589,0.698 0.622,0.677 0.652,0.652 0.677,0.622 0.698,0.589 0.713,0.552 0.722,0.514 0.725,-0.475 0.722,-0.514 0.713,-0.552 0.698,-0.589 0.677,-0.622 0.652,-0.652 0.622,-0.677 0.589,-0.698 0.552,-0.713 0.514,-0.722 0.475,-0.725
Top Overlay:
  circle w0.15: c-1.9,1.4 r0.125
  lines w0.12: -1.55,-1.175 -1.55,-1.55 -1.175,-1.55 ; -1.55,1.175 -1.55,1.55 -1.175,1.55 ; 1.175,-1.55 1.55,-1.55 1.55,-1.175 ; 1.175,1.55 1.55,1.55 1.55,1.175
Top Paste:
  region: 0.07,-0.07 0.546,-0.07 0.546,-0.546 0.07,-0.546
  region: -0.546,-0.546 -0.546,-0.07 -0.07,-0.07 -0.07,-0.546
  region: -0.55,0.07 -0.55,0.525 -0.07,0.525 -0.07,0.07
  region: 0.07,0.07 0.07,0.546 0.546,0.546 0.546,0.07
Top Solder:
  region: 0,-0.725 -0.475,-0.725 -0.514,-0.722 -0.552,-0.713 -0.589,-0.698 -0.622,-0.677 -0.652,-0.652 -0.677,-0.622 -0.698,-0.589 -0.713,-0.552 -0.722,-0.514 -0.725,0.475 -0.475,0.725 0.475,0.725 0.514,0.722 0.552,0.713 0.589,0.698 0.622,0.677 0.652,0.652 0.677,0.622 0.698,0.589 0.713,0.552 0.722,0.514 0.725,-0.475 0.722,-0.514 0.713,-0.552 0.698,-0.589 0.677,-0.622 0.652,-0.652 0.622,-0.677 0.589,-0.698 0.552,-0.713 0.514,-0.722 0.475,-0.725
Bottom Solder:
  rectangle: -0.8,-0.8 0.8,0.8
TopAssy 13:
  circle w0.15: c-1.15,1.125 r0.127
  lines w0.12: -1.55,-1.55 1.55,-1.55 1.55,1.55 -1.55,1.55 -1.55,-1.55
  lines w0.15: -1.5,-0.875 -1.225,-0.875 ccw(c-1.225,-0.75) -1.225,-0.625 -1.5,-0.625 -1.5,-0.875 ; -1.5,-0.375 -1.225,-0.375 ccw(c-1.225,-0.25) -1.225,-0.125 -1.5,-0.125 -1.5,-0.375 ; -1.5,0.125 -1.225,0.125 ccw(c-1.225,0.25) -1.225,0.375 -1.5,0.375 -1.5,0.125 ; -1.5,0.625 -1.225,0.625 ccw(c-1.225,0.75) -1.225,0.875 -1.5,0.875 -1.5,0.625 ; -0.875,-1.5 -0.875,-1.225 cw(c-0.75,-1.225) -0.625,-1.225 -0.625,-1.5 -0.875,-1.5 ; -0.875,1.225 ccw(c-0.75,1.225) -0.625,1.225 -0.625,1.5 -0.875,1.5 -0.875,1.225 ; -0.725,-0.475 ccw(c-0.475,-0.475) -0.475,-0.725 0.475,-0.725 ccw(c0.475,-0.475) 0.725,-0.475 0.725,0.475 ccw(c0.475,0.475) 0.475,0.725 -0.475,0.725 -0.725,0.475 -0.725,-0.475 ; -0.375,-1.5 -0.375,-1.225 cw(c-0.25,-1.225) -0.125,-1.225 -0.125,-1.5 -0.375,-1.5 ; -0.375,1.225 ccw(c-0.25,1.225) -0.125,1.225 -0.125,1.5 -0.375,1.5 -0.375,1.225 ; 0.125,-1.5 0.125,-1.225 cw(c0.25,-1.225) 0.375,-1.225 0.375,-1.5 0.125,-1.5 ; 0.125,1.225 ccw(c0.25,1.225) 0.375,1.225 0.375,1.5 0.125,1.5 0.125,1.225 ; 0.625,-1.5 0.625,-1.225 cw(c0.75,-1.225) 0.875,-1.225 0.875,-1.5 0.625,-1.5 ; 0.625,1.225 ccw(c0.75,1.225) 0.875,1.225 0.875,1.5 0.625,1.5 0.625,1.225 ; 1.225,-0.875 cw(c1.225,-0.75) 1.225,-0.625 1.5,-0.625 1.5,-0.875 1.225,-0.875 ; 1.225,-0.375 cw(c1.225,-0.25) 1.225,-0.125 1.5,-0.125 1.5,-0.375 1.225,-0.375 ; 1.225,0.125 cw(c1.225,0.25) 1.225,0.375 1.5,0.375 1.5,0.125 1.225,0.125 ; 1.225,0.625 cw(c1.225,0.75) 1.225,0.875 1.5,0.875 1.5,0.625 1.225,0.625
CourtTop 15:
  circle w0.05: c0,0 r0.25
  lines w0.05: -0.35,0 0.35,0 ; 0,-0.35 0,0.35 ; -1.965,-1.085 -1.965,1.085 -1.75,1.085 -1.75,1.75 -1.085,1.75 -1.085,1.965 1.085,1.965 1.085,1.75 1.75,1.75 1.75,1.085 1.965,1.085 1.965,-1.085 1.75,-1.085 1.75,-1.75 1.085,-1.75 1.085,-1.965 -1.085,-1.965 -1.085,-1.75 -1.75,-1.75 -1.75,-1.085 -1.965,-1.085
3D body "QFN17P50_300X300X80L40X25T145.STEP": height 0.8, standoff 0, extent -1.55,-1.55 1.55,1.55

## QFN16(S-PWQFN-N16) [mm] "Quad Flat No-Lead (QFN with Tab), 0.50 mm pitch; square, 4 pin X 4 pin, 3.00 mm L X 3.00 mm W X 0.80 mm H body"
height 0.8
pads (17):
  rrect52% 0.85x0.24 smd mask+0.075: 1(-1.475,0.75) 2(-1.475,0.25) 3(-1.475,-0.25) 4(-1.475,-0.75) 9(1.475,-0.75) 10(1.475,-0.25) 11(1.475,0.25) 12(1.475,0.75)
  rrect52% 0.24x0.85 smd mask+0.075: 5(-0.75,-1.475) 6(-0.25,-1.475) 7(0.25,-1.475) 8(0.75,-1.475) 13(0.75,1.475) 14(0.25,1.475) 15(-0.25,1.475) 16(-0.75,1.475)
  rect 1.2x0.8 smd paste-1 mask+0: 17(0,0)
via 0,0 diameter 0.6 hole 0.3
Top Overlay:
  circle w0.15: c-1.9,1.4 r0.125
  lines w0.12: -1.55,-1.175 -1.55,-1.55 -1.175,-1.55 ; -1.55,1.175 -1.55,1.55 -1.175,1.55 ; 1.175,-1.55 1.55,-1.55 1.55,-1.175 ; 1.175,1.55 1.55,1.55 1.55,1.175
Top Paste:
  region: 0.55,-0.35 -0.55,-0.35 -0.55,0.35 0.55,0.35
Bottom Solder:
  region: 0.6,-0.4 0.6,0.4 -0.6,0.4 -0.6,-0.4
TopAssy 13:
  circle w0.15: c-1.2,1.2 r0.127
  lines w0.12: -1.55,-1.55 1.55,-1.55 1.55,1.55 -1.55,1.55 -1.55,-1.55
  lines w0.15: -1.5,-0.875 -1.225,-0.875 ccw(c-1.225,-0.75) -1.225,-0.625 -1.5,-0.625 -1.5,-0.875 ; -1.5,-0.375 -1.225,-0.375 ccw(c-1.225,-0.25) -1.225,-0.125 -1.5,-0.125 -1.5,-0.375 ; -1.5,0.125 -1.225,0.125 ccw(c-1.225,0.25) -1.225,0.375 -1.5,0.375 -1.5,0.125 ; -1.5,0.625 -1.225,0.625 ccw(c-1.225,0.75) -1.225,0.875 -1.5,0.875 -1.5,0.625 ; -0.875,-1.5 -0.875,-1.225 cw(c-0.75,-1.225) -0.625,-1.225 -0.625,-1.5 -0.875,-1.5 ; -0.875,1.225 ccw(c-0.75,1.225) -0.625,1.225 -0.625,1.5 -0.875,1.5 -0.875,1.225 ; -0.6,-0.4 0.625,-0.4 0.625,0.4 -0.3,0.4 -0.6,0.1 -0.6,-0.4 ; -0.375,-1.5 -0.375,-1.225 cw(c-0.25,-1.225) -0.125,-1.225 -0.125,-1.5 -0.375,-1.5 ; -0.375,1.225 ccw(c-0.25,1.225) -0.125,1.225 -0.125,1.5 -0.375,1.5 -0.375,1.225 ; 0.125,-1.5 0.125,-1.225 cw(c0.25,-1.225) 0.375,-1.225 0.375,-1.5 0.125,-1.5 ; 0.125,1.225 ccw(c0.25,1.225) 0.375,1.225 0.375,1.5 0.125,1.5 0.125,1.225 ; 0.625,-1.5 0.625,-1.225 cw(c0.75,-1.225) 0.875,-1.225 0.875,-1.5 0.625,-1.5 ; 0.625,1.225 ccw(c0.75,1.225) 0.875,1.225 0.875,1.5 0.625,1.5 0.625,1.225 ; 1.225,-0.875 cw(c1.225,-0.75) 1.225,-0.625 1.5,-0.625 1.5,-0.875 1.225,-0.875 ; 1.225,-0.375 cw(c1.225,-0.25) 1.225,-0.125 1.5,-0.125 1.5,-0.375 1.225,-0.375 ; 1.225,0.125 cw(c1.225,0.25) 1.225,0.375 1.5,0.375 1.5,0.125 1.225,0.125 ; 1.225,0.625 cw(c1.225,0.75) 1.225,0.875 1.5,0.875 1.5,0.625 1.225,0.625
CourtTop 15:
  circle w0.05: c0,0 r0.25
  lines w0.05: -0.35,0 0.35,0 ; 0,-0.35 0,0.35 ; -2.1,-1.085 -2.1,1.085 -1.75,1.085 -1.75,1.75 -1.085,1.75 -1.085,2.1 1.085,2.1 1.085,1.75 1.75,1.75 1.75,1.085 2.1,1.085 2.1,-1.085 1.75,-1.085 1.75,-1.75 1.085,-1.75 1.085,-2.1 -1.085,-2.1 -1.085,-1.75 -1.75,-1.75 -1.75,-1.085 -2.1,-1.085
3D body "QFN17P50_300X300X80L40X25T145.STEP": height 0.8, standoff 0, extent -1.55,-1.55 1.55,1.55